# Altium footprint library Lib_001.PcbLib: 429 footprints (part 23 of 28)
Each footprint in its own frame and in the unit in brackets; x right, y up, seen from the top. Pads: shape width x height; smd on the part's side, far side on the other; paste and mask are expansions set on the pad; w line width, h text height; cw(c..) or ccw(c..) is an arc to the next point about the centre after c.
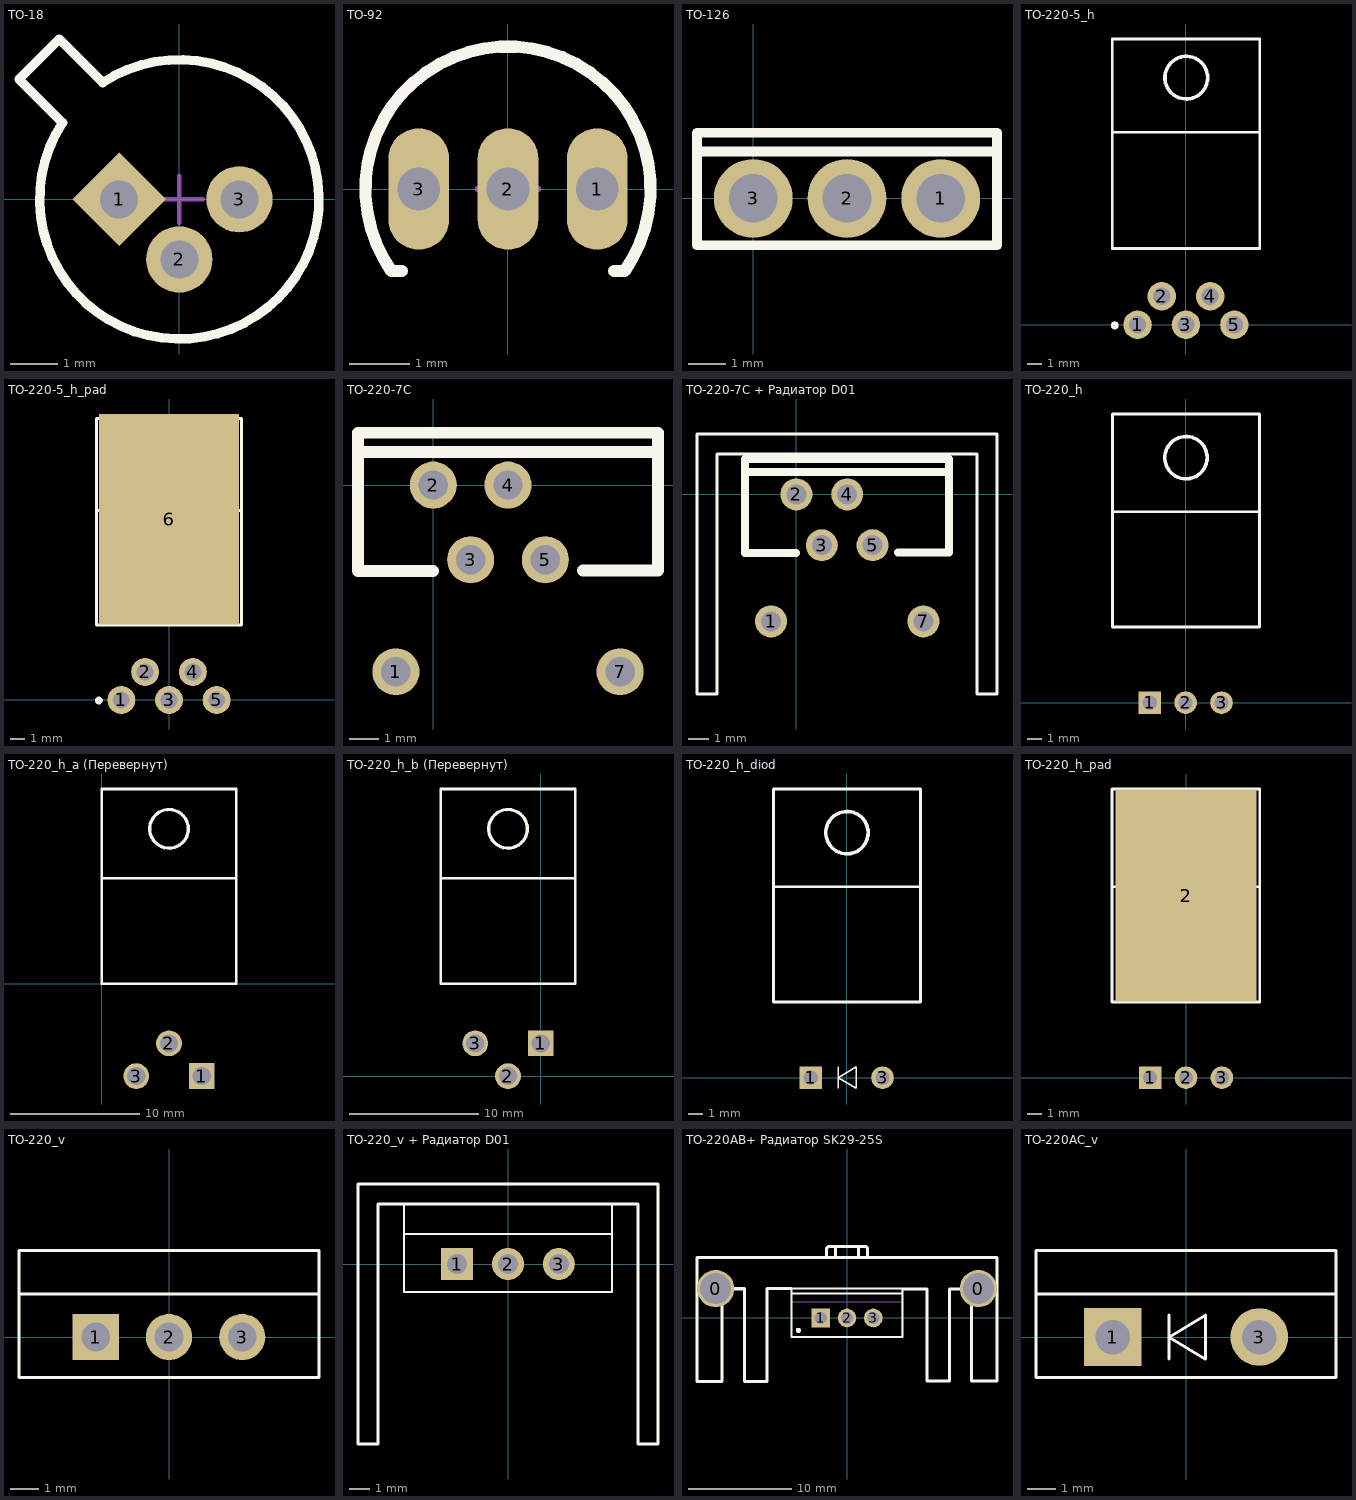
[diagram p22: the footprints below, top view; thin cyan lines are the x and y axes]

## TO-18 [mm] "Can; 3 Leads; Pin Circle Dia. 2.54 mm; Lead Dia. 0.48 mm (max)"
height 5.33
pads (3):
  rect 1.4x1.4 hole 0.8 rot 45: 1(-1.27,0)
  round 1.4 hole 0.8: 2(0,-1.27) 3(1.27,0)
Top Overlay:
  lines w0.2: -3.386,2.537 -2.467,1.618 ccw(c0,0) -1.618,2.467 -2.537,3.386 -3.386,2.537
Mechanical 15:
  lines w0.1: -0.5,0 0.5,0 ; 0,-0.5 0,0.5
3D body "User Library-TO-18_2N2222.step": height 6.6, standoff -1.79, extent -2.833,-2.775 2.775,2.833

## TO-92 [mm]
pads (3):
  oval 1x2 hole 0.7: 1(1.47,0) 2(0,0) 3(-1.47,0)
Top Overlay:
  lines w0.2: -1.75,-1.35 -1.92,-1.35 cw(c0,0) 1.92,-1.35 1.75,-1.35
Mechanical 15:
  lines w0.1: -0.5,0 0.5,0 ; 0,-0.5 0,0.5
3D body "User Library-TO-92_Str.STEP": height 10, standoff -3, extent -2.613,-1.59 2.613,2.613

## TO-126 [mm]
pads (3):
  round 2.1 hole 1.3: 1(5,0) 2(2.5,0) 3(0,0)
Top Overlay:
  lines w0.254: -1.5,1.25 -1.5,1.75 6.5,1.75 6.5,1.25 ; -1.5,1.25 6.5,1.25 ; -1.5,1.25 -1.5,-0.375 -1.5,-1.25 6.5,-1.25 6.5,1.25
3D body "User Library-BD135 (TO-126,SOT32) v4.STEP": height 15.6, standoff -2.35, extent -1.375,-1.375 6.425,1.325

## TO-220-5_h [mm]
height 4.7
pads (5):
  round 2 hole 1.2: 1(-3.4,0) 2(-1.7,2) 3(0,0) 4(1.7,2) 5(3.4,0)
Top Overlay:
  circle w0.254: c0.025,17.35 r1.5
  circle w0.254: c-5,-0.04 r0.153
  lines w0.203: -5.175,13.515 5.182,13.515 ; -5.175,5.35 5.182,5.35 5.182,20.066 -5.175,20.066 -5.175,5.35
3D body "alsrobot-TO-220-5.STEP": height 4.06, standoff -6.44, extent -5.081,-0.152 5.081,20.015

## TO-220-5_h_pad [mm]
height 4.7
pads (6):
  round 2 hole 1.2: 1(-3.4,0) 2(-1.7,2) 3(0,0) 4(1.7,2) 5(3.4,0)
  rect 10x15 smd: 6(0,12.895)
Top Overlay:
  circle w0.254: c-5,-0.04 r0.153
  circle w0.254: c0.025,17.35 r1.5
  lines w0.203: -5.175,13.515 5.182,13.515 ; -5.175,5.35 5.182,5.35 5.182,20.066 -5.175,20.066 -5.175,5.35
3D body "alsrobot-TO-220-5.STEP": height 4.56, standoff -5.94, extent -5.081,-0.153 5.081,20.015

## TO-220-7C [mm]
pads (6):
  round 1.6 hole 1: 1(-1.27,-6.35) 2(0,0) 3(1.27,-2.54) 4(2.54,0) 5(3.81,-2.54) 7(6.35,-6.35)
Top Overlay:
  lines w0.4: -2.54,1.12 7.62,1.12 ; -0.01,-2.92 -2.56,-2.92 -2.56,1.78 7.64,1.78 7.64,-2.91 5.09,-2.91
3D body "User Library-TO-220-7C.step": height 19.94, standoff -1.5, extent -2.64,-6.55 7.76,1.58

## TO-220-7C + Радиатор D01 [mm]
pads (6):
  round 1.6 hole 1: 1(-1.27,-6.35) 2(0,0) 3(1.27,-2.54) 4(2.54,0) 5(3.81,-2.54) 7(6.35,-6.35)
Top Overlay:
  lines w0.1: -2.67,2.02 7.73,2.02
  lines w0.15: -4.97,-9.98 -4.97,2.02 -4.97,3.02 -3.97,3.02 9.03,3.02 10.03,3.02 10.03,2.02 10.03,-9.98 9.03,-9.98 9.03,2.02 2.53,2.02 -3.97,2.02 -3.97,-9.98 -4.97,-9.98
  lines w0.4: -2.54,1.12 7.62,1.12 ; -0.01,-2.92 -2.56,-2.92 -2.56,1.78 7.64,1.78 7.64,-2.91 5.09,-2.91
3D body "User Library-TO-220-7C.step": height 19.94, standoff -1.5, extent -2.64,-6.55 7.76,1.58
3D body: height 24, standoff 5, extent -4.97,-9.98 10.03,3.02

## TO-220_h [mm]
height 4.7
pads (3):
  rect 1.6x1.6 hole 1: 1(-2.54,0)
  round 1.6 hole 1: 2(0,0) 3(2.54,0)
Top Overlay:
  circle w0.254: c0.025,17.35 r1.5
  lines w0.203: -5.175,13.515 5.225,13.515 ; -5.175,5.35 5.225,5.35 5.225,20.44 -5.175,20.44 -5.175,5.35
3D body "TO-220AC_horiz.STEP": height 4.4, standoff -3, extent -5.2,-0.25 5.2,20.5

## TO-220_h_a (Перевернут) [mm]
height 4.7
pads (3):
  rect 2x2 hole 1.4: 1(7.74,-7.17)
  round 2 hole 1.4: 2(5.2,-4.63) 3(2.66,-7.17)
Top Overlay:
  circle w0.254: c5.2,12 r1.5
  lines w0.203: 0,8.165 10.4,8.165 ; 0,0 0,15.09 10.4,15.09 10.4,0 0,0
3D body "User Library-User Library-TO220 L.step": height 4.5, standoff -3.7, extent 0.2,-4.824 10.2,14.88

## TO-220_h_b (Перевернут) [mm]
height 4.7
pads (3):
  rect 2x2 hole 1.4: 1(0,2.54)
  round 2 hole 1.4: 2(-2.54,0) 3(-5.08,2.54)
Top Overlay:
  circle w0.254: c-2.54,19.17 r1.5
  lines w0.203: -7.74,15.335 2.66,15.335 ; -7.74,7.17 -7.74,22.26 2.66,22.26 2.66,7.17 -7.74,7.17
3D body "User Library-Part1-106.step": height 4.86, standoff -3.95, extent -7.48,-0.449 2.54,22.801

## TO-220_h_diod [mm]
height 4.7
pads (2):
  rect 1.6x1.6 hole 1: 1(-2.54,0)
  round 1.6 hole 1: 3(2.54,0)
Top Overlay:
  circle w0.254: c0.025,17.35 r1.5
  lines w0.1: -0.593,-0.762 -0.593,0.762 ; -0.593,0 0.677,0.762 0.677,-0.762 -0.593,0
  lines w0.203: -5.175,13.515 5.225,13.515 ; -5.175,5.35 5.225,5.35 5.225,20.44 -5.175,20.44 -5.175,5.35
3D body "TO-220AC_horiz.STEP": height 4.4, standoff -3, extent -5.2,-0.25 5.2,20.5

## TO-220_h_pad [mm]
height 4.7
pads (4):
  rect 1.6x1.6 hole 1: 1(-2.54,0)
  round 1.6 hole 1: 2(0,0) 3(2.54,0)
  rect 10x15 smd: 2(0,12.895)
Top Overlay:
  circle w0.254: c0.025,17.35 r1.5
  lines w0.203: -5.175,13.515 5.225,13.515 ; -5.25,5.35 5.225,5.35 5.225,20.44 -5.25,20.44 -5.25,5.35
3D body "TO-220AC_horiz.STEP": height 4.4, standoff -3, extent -5.2,-0.25 5.2,20.5

## TO-220_v [mm]
height 4.7
pads (3):
  rect 1.6x1.6 hole 1: 1(-2.54,0)
  round 1.6 hole 1: 2(0,0) 3(2.54,0)
Top Overlay:
  lines w0.1: -5.2,1.5 5.2,1.5 ; -5.2,-1.4 5.2,-1.4 5.2,3 -5.2,3 -5.2,-1.4
3D body "TO-220AC_vert.STEP": height 19.5, standoff -2.5, extent -5.2,-1.4 5.2,3

## TO-220_v + Радиатор D01 [mm]
height 4.7
pads (3):
  rect 1.6x1.6 hole 1: 1(-2.54,0)
  round 1.6 hole 1: 2(0,0) 3(2.54,0)
Top Overlay:
  lines w0.1: -5.2,1.5 5.2,1.5 ; -5.2,-1.4 -5.2,3 5.2,3 5.2,-1.4 -5.2,-1.4
  lines w0.15: -7.5,-9 -6.5,-9 -6.5,3 0,3 6.5,3 6.5,-9 7.5,-9 7.5,3 7.5,4 6.5,4 -6.5,4 -7.5,4 -7.5,3 -7.5,-9
3D body "TO-220AC_vert.STEP": height 19.5, standoff -2.5, extent -5.2,-1.4 5.2,3
3D body: height 24, standoff 5, extent -7.5,-9 7.5,4

## TO-220AB+ Радиатор SK29-25S [mm] "TO, Thru-Hole, Vertical, Heatsink Mounted; 3 In-Line Leads; Pitch 2.54 mm"
height 19.3
pads (5):
  round 3.6 hole 3: 0(-12.7,2.84) 0(12.7,2.84)
  rect 1.8x1.8 hole 1.2: 1(-2.54,0)
  round 1.8 hole 1.2: 2(0,0) 3(2.54,0)
Top Overlay:
  circle w0.25: c-4.7,-1.2 r0.125
  lines w0.2: -5.35,2.35 5.35,2.35 ; -5.35,-1.85 -5.35,2.85 5.35,2.85 5.35,-1.85 -5.35,-1.85
  lines w0.3: -14.5,-6.14 -14.5,0 -14.5,2.79 ; -14.5,2.85 -14.5,5.85 14.5,5.85 14.5,2.85 ; -14.49,-6.15 -12.07,-6.15 -12.07,2.78 ; -12.025,2.825 -9.925,2.825 -9.925,0.665 -9.925,-6.15 -7.78,-6.15 ; -7.75,-6.12 -7.75,0 -7.75,2.84 ; -7.74,2.85 -5.35,2.85 ; -2,6.617 -2,5.85 0,5.85 2,5.85 2,6.62 ; -1.996,6.617 cw(c-1.697,6.61) -1.69,6.91 ; -1.69,6.92 1.7,6.92 ; -1.12,5.88 -1.12,6.9 ; 1.12,5.9 1.12,6.92 ; 1.693,6.92 cw(c1.7,6.62) 2,6.627 ; 5.41,2.79 7.75,2.79 7.75,0 7.75,-6.08 9.895,-6.08 9.895,2.765 ; 9.895,2.79 11.88,2.79 ; 12.04,2.95 12.04,-6.08 14.43,-6.08 ; 14.5,-6.11 14.5,0 14.5,2.81
Mechanical 13:
  lines w0.1: -5.35,1.55 5.35,1.55 ; -5.35,-1.85 5.35,-1.85 5.35,2.85 -5.35,2.85 -5.35,-1.85
Mechanical 15:
  lines w0.1: -0.5,0 0.5,0 ; 0,-0.5 0,0.5
3D body "43ctq100.stp": height 24.26, standoff -6.73, extent -5.305,-1.658 5.365,3.172
3D body: height 25, standoff 0, extent -14.5,-6.15 14.5,5.85
3D body: height 0, standoff -2.5, extent -13.841,1.692 -11.55,3.988
3D body: height 0, standoff -2.5, extent 11.559,1.692 13.85,3.988

## TO-220AC_v [mm]
height 4.7
pads (2):
  rect 2x2 hole 1.2: 1(-2.54,0)
  round 2 hole 1.2: 3(2.54,0)
Top Overlay:
  lines w0.1: -5.2,1.5 5.2,1.5 ; -0.593,-0.762 -0.593,0.762 ; -5.2,-1.4 5.2,-1.4 5.2,3 -5.2,3 -5.2,-1.4 ; -0.593,0 0.677,-0.762 0.677,0.762 -0.593,0
3D body "diodo-to220.stp": height 19.5, standoff -4.5, extent -5.2,-1.45 5.2,3.05